# Altium footprint library etherceptor.PcbLib: 98 footprints (part 1 of 7)
Each footprint in its own frame and in the unit in brackets; x right, y up, seen from the top. Pads: shape width x height; smd on the part's side, far side on the other; paste and mask are expansions set on the pad; w line width, h text height; cw(c..) or ccw(c..) is an arc to the next point about the centre after c.
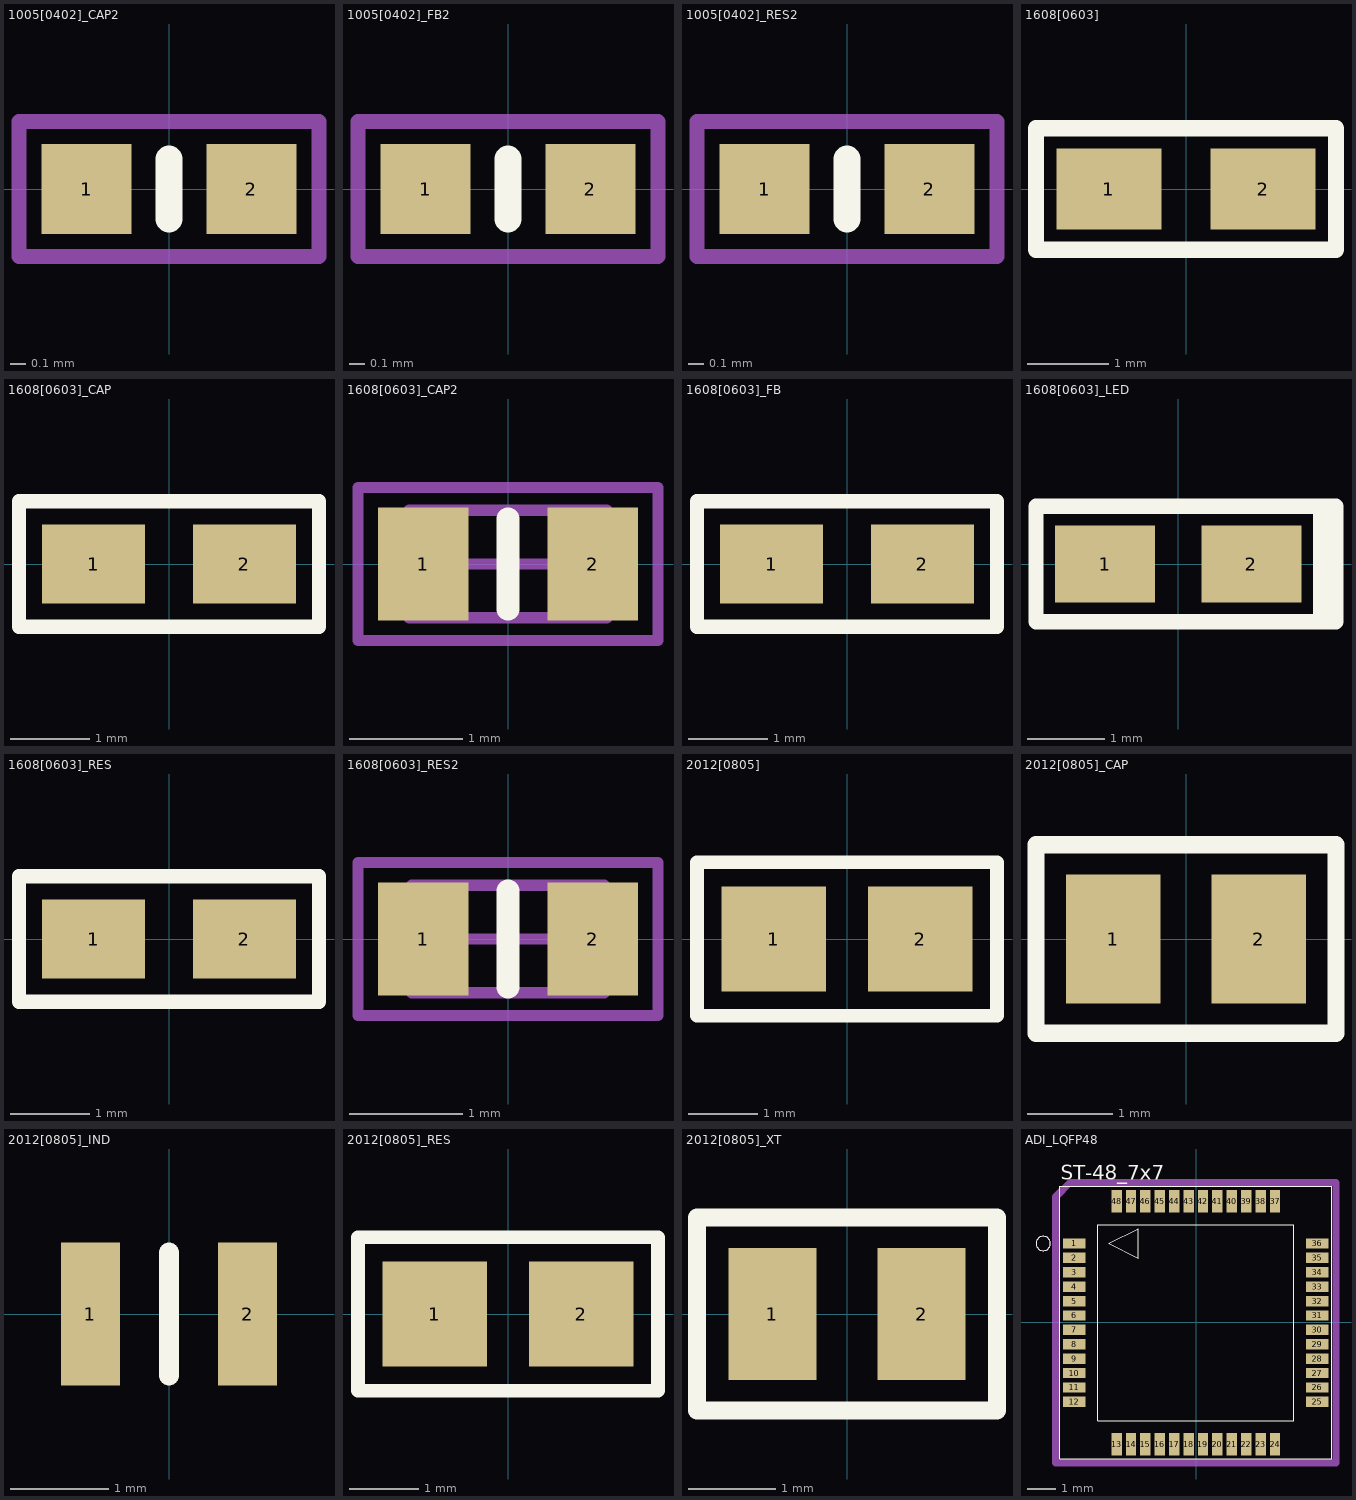
[diagram p0: the footprints below, top view; thin cyan lines are the x and y axes]

## 1005[0402]_CAP2 [mm] "Chip Capacitor, Body 1.0x0.5mm, IPC Medium Density"
height 0.6
pads (2):
  rect 0.6x0.6 smd: 1(-0.55,0) 2(0.55,0)
Top Overlay:
  lines w0.18: 0,-0.2 0,0.2
Mechanical 15:
  lines w0.1: -1,-0.45 -1,0.45 1,0.45 1,-0.45 -1,-0.45
3D body "User Library-Capacitor 0402.step": height 0.5, standoff 0, extent -0.5,-0.25 0.5,0.25

## 1005[0402]_FB2 [mm] "Chip Ferrite Bead, Body 1.0x0.5mm, IPC Medium Density"
height 0.6
pads (2):
  rect 0.6x0.6 smd: 1(-0.55,0) 2(0.55,0)
Top Overlay:
  lines w0.18: 0,-0.2 0,0.2
Mechanical 15:
  lines w0.1: -1,-0.45 1,-0.45 1,0.45 -1,0.45 -1,-0.45
3D body "User Library-FB_1005.STEP": height 0.51, standoff 0.01, extent -0.5,-0.25 0.5,0.25

## 1005[0402]_RES2 [mm] "Chip Capacitor, Body 1.0x0.5mm, IPC Medium Density"
height 0.6
pads (2):
  rect 0.6x0.6 smd: 1(-0.55,0) 2(0.55,0)
Top Overlay:
  lines w0.18: 0,-0.2 0,0.2
Mechanical 15:
  lines w0.1: -1,-0.45 -1,0.45 1,0.45 1,-0.45 -1,-0.45
3D body "User Library-RESC1005X04N.step": height 0.35, standoff 0, extent -0.5,-0.25 0.5,0.25

## 1608[0603] [mm] "Chip Resistor / Capacitor; Body 1.6 x 0.8 mm (LxW typ) Handsoldering optimized"
height 0.6
pads (2):
  rect 1.3x1 smd: 1(-0.95,0) 2(0.95,0)
Top Overlay:
  lines w0.2: -1.85,-0.75 1.85,-0.75 1.85,0.75 -1.85,0.75 -1.85,-0.75

## 1608[0603]_CAP [mm] "Chip Resistor / Capacitor; Body 1.6 x 0.8 mm (LxW typ) Handsoldering optimized"
height 0.6
pads (2):
  rect 1.3x1 smd: 1(-0.95,0) 2(0.95,0)
Top Overlay:
  lines w0.18: -1.89,-0.79 1.89,-0.79 1.89,0.79 -1.89,0.79 -1.89,-0.79
3D body "User Library-Chip Capacitor 0603.STEP": height 0.8, standoff 0, extent -0.8,-0.425 0.8,0.435

## 1608[0603]_CAP2 [mm] "Chip Capacitor, Body 1.6x0.8mm, IPC Medium Density"
height 0.85
pads (2):
  rect 0.8x1 smd: 1(-0.75,0) 2(0.75,0)
Top Overlay:
  lines w0.2: 0,-0.4 0,0.4
Mechanical 13:
  lines w0.1: -0.875,-0.475 0.875,-0.475 0.875,0.475 -0.875,0.475 -0.875,-0.475
Mechanical 15:
  lines w0.1: -0.475,0 0.475,0 ; 0,-0.475 0,0.475 ; -1.325,-0.675 1.325,-0.675 1.325,0.675 -1.325,0.675 -1.325,-0.675
3D body "User Library-Chip Capacitor2CAPC0816X61N.STEP": height 0.86, standoff 0, extent -0.8,-0.4 0.8,0.4

## 1608[0603]_FB [mm] "Chip Resistor / Capacitor; Body 1.6 x 0.8 mm (LxW typ) Handsoldering optimized"
height 0.6
pads (2):
  rect 1.3x1 smd: 1(-0.95,0) 2(0.95,0)
Top Overlay:
  lines w0.18: -1.89,-0.79 -1.89,0.79 1.89,0.79 1.89,-0.79 -1.89,-0.79
3D body "User Library-Chip Capacitor 0603.STEP": height 0.8, standoff 0, extent -0.8,-0.425 0.8,0.435

## 1608[0603]_LED [mm] "LED; Body 1.6 x 0.8 mm (LxW typ) Handsoldering optimized"
height 0.6
pads (2):
  rect 1.3x1 smd: 1(-0.95,0) 2(0.95,0)
Top Overlay:
  lines w0.2: 1.85,-0.75 1.85,0.75 ; -1.85,-0.75 2.05,-0.75 2.05,0.75 -1.85,0.75 -1.85,-0.75
3D body "User Library-led_0603LED0603 green.STEP": height 0.6, standoff 0, extent -0.79,-0.4 0.83,0.4

## 1608[0603]_RES [mm] "Chip Resistor / Capacitor; Body 1.6 x 0.8 mm (LxW typ) Handsoldering optimized"
height 0.6
pads (2):
  rect 1.3x1 smd: 1(-0.95,0) 2(0.95,0)
Top Overlay:
  lines w0.18: -1.89,-0.79 1.89,-0.79 1.89,0.79 -1.89,0.79 -1.89,-0.79
3D body "User Library-RESC1608X05N.STEP": height 0.45, standoff 0, extent -0.775,-0.425 0.775,0.425

## 1608[0603]_RES2 [mm] "Chip Resistor, Body 1.6x0.8mm, IPC Medium Density"
height 0.6
pads (2):
  rect 0.8x1 smd: 1(-0.75,0) 2(0.75,0)
Top Overlay:
  lines w0.2: 0,-0.425 0,0.425
Mechanical 13:
  lines w0.1: -0.85,-0.475 -0.85,0.475 0.85,0.475 0.85,-0.475 -0.85,-0.475
Mechanical 15:
  lines w0.1: -0.475,0 0.475,0 ; 0,-0.475 0,0.475 ; -1.325,-0.675 -1.325,0.675 1.325,0.675 1.325,-0.675 -1.325,-0.675
3D body "User Library-RESC1608X05N.STEP": height 0.45, standoff 0, extent -0.775,-0.425 0.775,0.425

## 2012[0805] [mm] "Chip Resistor / Capacitor; Body 2.0 x 1.3 mm (LxW typ) Handsoldering optimized"
height 0.65
pads (2):
  rect 1.5x1.5 smd: 1(-1.05,0) 2(1.05,0)
Top Overlay:
  lines w0.2: -2.15,-1.1 2.15,-1.1 2.15,1.1 -2.15,1.1 -2.15,-1.1

## 2012[0805]_CAP [mm] "Chip Resistor / Capacitor; Body 2.0 x 1.3 mm (LxW typ) Handsoldering optimized"
height 0.65
pads (2):
  rect 1.1x1.5 smd: 1(-0.85,0) 2(0.85,0)
Top Overlay:
  lines w0.2: -1.75,-1.1 1.75,-1.1 1.75,1.1 -1.75,1.1 -1.75,-1.1
3D body "SW3dPS-0805 SMD Capacitor.STEP": height 0.78, standoff 0, extent -1,-0.625 1,0.625

## 2012[0805]_IND [mm]
pads (2):
  rect 0.6x1.45 smd: 1(-0.8,0) 2(0.8,0)
Top Overlay:
  lines w0.2: 0,-0.625 0,0.625
3D body "User Library-Ind0805.step": height 1.8, standoff -0.05, extent -1.05,-0.75 1.05,0.75

## 2012[0805]_RES [mm] "Chip Resistor / Capacitor; Body 2.0 x 1.3 mm (LxW typ) Handsoldering optimized"
height 0.65
pads (2):
  rect 1.5x1.5 smd: 1(-1.05,0) 2(1.05,0)
Top Overlay:
  lines w0.2: -2.15,-1.1 2.15,-1.1 2.15,1.1 -2.15,1.1 -2.15,-1.1
3D body "SW3dPS-0805 SMD Resistor.STEP": height 0.78, standoff 0, extent -1,-0.625 1,0.625

## 2012[0805]_XT [mm] "Chip Resistor / Capacitor; Body 2.0 x 1.3 mm (LxW typ) Handsoldering optimized"
height 0.65
pads (2):
  rect 1x1.5 smd: 1(-0.85,0) 2(0.85,0)
Top Overlay:
  lines w0.2: -1.71,-1.1 1.71,-1.1 1.71,1.1 -1.71,1.1 -1.71,-1.1
3D body "User Library-ABS06.STEP": height 0.6, standoff 0, extent -1,-0.61 1,0.61

## ADI_LQFP48 [mil]
pads (48):
  rect 31.1x14.2 smd: 1(-166.5,107.9) 2(-166.5,88.2) 3(-166.5,68.5) 4(-166.5,48.8) 5(-166.5,29.1) 6(-166.5,9.4) 7(-166.5,-10.2) 8(-166.5,-29.9) 9(-166.5,-49.6) 10(-166.5,-69.3) 11(-166.5,-89) 12(-166.5,-108.7) 25(165.7,-108.7) 26(165.7,-89) 27(165.7,-69.3) 28(165.7,-49.6) 29(165.7,-29.9) 30(165.7,-10.2) 31(165.7,9.4) 32(165.7,29.1) 33(165.7,48.8) 34(165.7,68.5) 35(165.7,88.2) 36(165.7,107.9)
  rect 14.2x31.1 smd: 13(-108.7,-166.5) 14(-89,-166.5) 15(-69.3,-166.5) 16(-49.6,-166.5) 17(-29.9,-166.5) 18(-10.2,-166.5) 19(9.4,-166.5) 20(29.1,-166.5) 21(48.8,-166.5) 22(68.5,-166.5) 23(88.2,-166.5) 24(107.9,-166.5) 37(107.9,165.7) 38(88.2,165.7) 39(68.5,165.7) 40(48.8,165.7) 41(29.1,165.7) 42(9.4,165.7) 43(-10.2,165.7) 44(-29.9,165.7) 45(-49.6,165.7) 46(-69.3,165.7) 47(-89,165.7) 48(-108.7,165.7)
Top Overlay:
  lines w0.4: -218.9,107.85 cw(c-209.05,107.85) -199.2,107.85 cw(c-209.05,107.85) -218.9,107.85 ; -186.6,-186.6 -186.6,185.8 185.8,185.8 185.8,-186.6 -186.6,-186.6 ; -134.3,-134.3 -134.3,133.5 133.5,133.5 133.5,-134.3 -134.3,-134.3 ; -119.3,107.9 -79.1,87.8 -79.1,127.9 -119.3,107.9
  text "ST-48_7x7" at -185,195 h20
Mechanical 16:
  lines w0.4: -218.9,107.85 cw(c-209.05,107.85) -199.2,107.85 cw(c-209.05,107.85) -218.9,107.85
  lines w10: -192.1,-192.1 -192.1,171.6 -172.4,191.3 191.3,191.3 191.3,-192.1 -192.1,-192.1